# Altium footprint library 3D封装库.PcbLib: 716 footprints (part 31 of 45)
Each footprint in its own frame and in the unit in brackets; x right, y up, seen from the top. Pads: shape width x height; smd on the part's side, far side on the other; paste and mask are expansions set on the pad; w line width, h text height; cw(c..) or ccw(c..) is an arc to the next point about the centre after c.
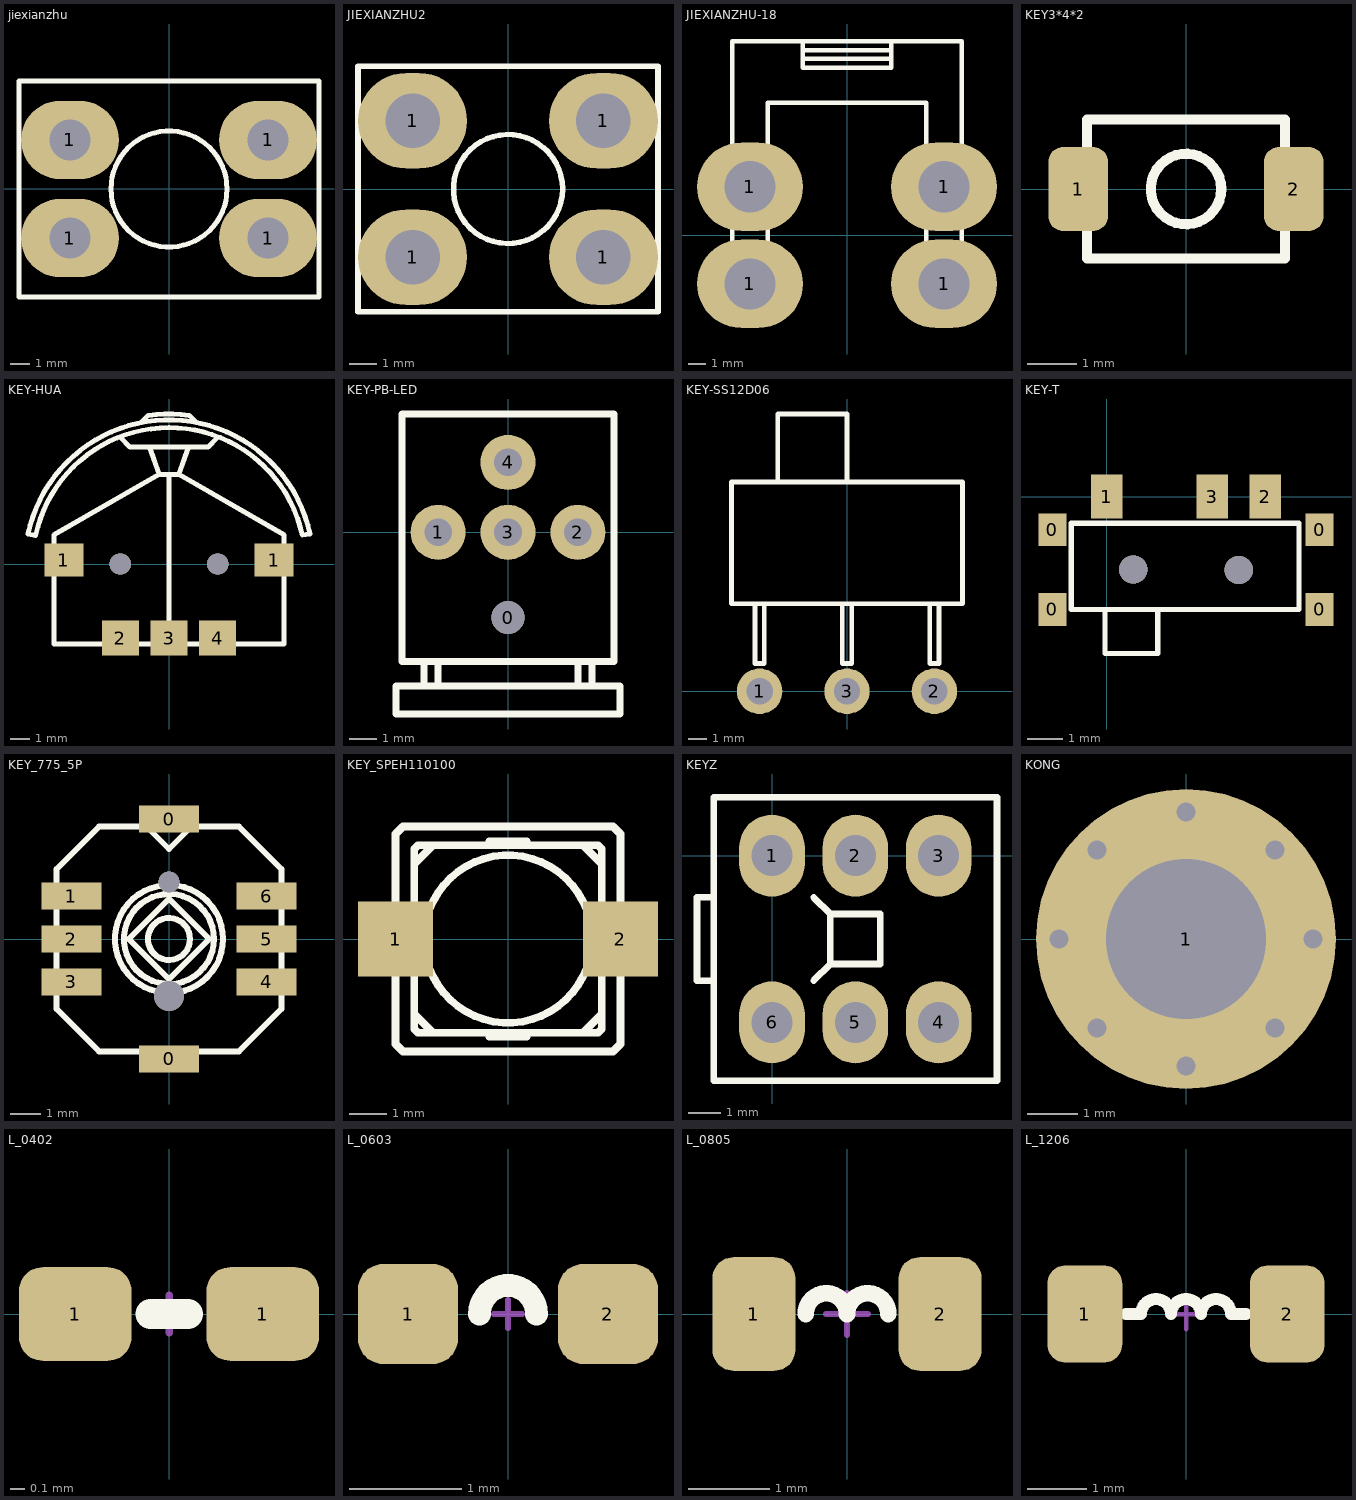
[diagram p30: the footprints below, top view; thin cyan lines are the x and y axes]

## jiexianzhu [mm]
pads (4):
  oval 5x4 hole 2.1: 1(-5.055,-2.511) 1(-5.055,2.489) 1(5.045,-2.511) 1(5.045,2.489)
Top Overlay:
  circle w0.254: c-0.005,-0.011 r2.959
  lines w0.254: -7.655,-5.511 7.645,-5.511 7.645,5.489 -7.655,5.489 -7.655,-5.511

## JIEXIANZHU2 [mm]
pads (4):
  oval 4x3.5 hole 2: 1(-3.5,-2.5) 1(-3.5,2.5) 1(3.5,-2.5) 1(3.5,2.5)
Top Overlay:
  circle w0.2: c0,0 r2
  lines w0.203: -5.5,-4.5 -5.5,4.5 5.5,4.5 5.5,-4.5 -5.5,-4.5

## JIEXIANZHU-18 [mm]
pads (4):
  oval 6x5 hole 2.9: 1(-5.5,-2.75) 1(-5.5,2.75) 1(5.5,-2.75) 1(5.5,2.75)
Top Overlay:
  lines w0.254: -2.5,10.5 2.5,10.5 ; -2.5,11 -2.5,10 ; 2.5,11 2.5,10 ; -2.5,10 -2.5,9.5 2.5,9.5 2.5,10 ; -2.5,10 2.5,10 ; -6.5,-4.5 -6.5,11 0,11 6.5,11 6.5,-4.5 4.5,-4.5 4.5,7.5 -4.5,7.5 -4.5,-4.5 -6.5,-4.5

## KEY3*4*2 [mm]
pads (2):
  rrect50% 1.2x1.7 smd: 1(-2.175,0) 2(2.175,0)
Top Overlay:
  circle w0.203: c0,0 r0.711
  lines w0.203: -2,-1.4 2,-1.4 2,1.4 -2,1.4 -2,-1.4
3D body "User Library-342button.STEP": height 2.01, standoff 0.01, extent -2.5,-1.5 2.5,1.5

## KEY-HUA [mm]
pads (5):
  rect 2x1.7 smd: 1(-5.4,0.2) 1(5.4,0.2)
  rect 1.9x1.8 smd: 2(-2.5,-3.8) 3(0,-3.8) 4(2.5,-3.8)
via 2.5,0 diameter 1.1 hole 1.1
via -2.5,0 diameter 1.1 hole 1.1
Top Overlay:
  lines w0.254: -2.5,6.5 -2,6 2,6 2.5,6.5 ; -1.386,7.3 -1.059,7.627 cw(c0,0) 1.031,7.631 1.362,7.3 ; -1,6 -0.5,4.6 ; 0,-4.1 0,4.6 ; 1,6 0.5,4.6 ; -0.5,4.6 0.5,4.6 ; -0.5,4.6 -5.9,1.5 -5.9,-4.1 5.9,-4.1 5.9,1.5 0.5,4.6 ; -7.237,1.544 cw(c0,0) 7.237,1.544 6.84,1.487 ccw(c0,0) -6.845,1.467 -7.237,1.544

## KEY-PB-LED [mm]
pads (5):
  round 1.2 hole 1.2: 0(0,-3.1)
  round 2 hole 1: 1(-2.54,0) 2(2.54,0) 3(0,0) 4(0,2.54)
Top Overlay:
  lines w0.254: -3.048,-4.7 -3.048,-5.588 -2.54,-5.588 -2.54,-4.7 ; 2.54,-4.7 2.54,-5.588 3.048,-5.588 3.048,-4.7 ; -4.064,-6.604 4.064,-6.604 4.064,-5.588 -4.064,-5.588 -4.064,-6.604 ; -3.85,-4.7 3.85,-4.7 3.85,4.3 -3.85,4.3 -3.85,-4.7

## KEY-SS12D06 [mm]
pads (3):
  round 2.5 hole 1.45: 1(-4.8,0) 2(4.8,0) 3(0,0)
Top Overlay:
  lines w0.254: -6.35,11.506 -6.35,4.8 6.35,4.8 6.35,11.5 -6.344,11.5 ; -5.054,4.8 -5.054,1.524 -4.546,1.524 -4.546,4.8 ; -3.81,11.5 -3.81,15.24 0,15.24 0,11.5 ; -0.254,4.8 -0.254,1.524 0.254,1.524 0.254,4.8 ; 4.546,4.8 4.546,1.524 5.054,1.524 5.054,4.8

## KEY-T [mm]
pads (7):
  rect 0.8x0.93 smd: 0(-1.55,-3.21) 0(-1.55,-0.94) 0(6.05,-3.21) 0(6.05,-0.94)
  rect 0.9x1.25 smd: 1(0,0) 2(4.5,0) 3(3,0)
via 0.75,-2.075 diameter 0.8 hole 0.8
via 3.75,-2.09 diameter 0.8 hole 0.8
Top Overlay:
  lines w0.15: -0.05,-3.21 -0.05,-4.46 1.45,-4.46 1.45,-3.21 ; -1.016,-3.21 -1.016,-0.762 5.461,-0.762 5.461,-3.21 -1.016,-3.21

## KEY_775_5P [mm]
pads (8):
  rect 2x0.9 smd: 0(0,-4) 0(0,4) 1(-3.25,1.425) 2(-3.25,0) 3(-3.25,-1.425) 4(3.25,-1.425) 5(3.25,0) 6(3.25,1.425)
via 0,-1.9 diameter 1 hole 1
via 0,1.9 diameter 0.7 hole 0.7
Top Overlay:
  circle w0.203: c0,0 r1.5
  circle w0.203: c0,0 r1.8
  circle w0.203: c0,0 r0.7
  lines w0.203: -0.75,3.75 0,3 0.75,3.75 ; -3.75,-2.331 -3.75,2.331 -2.331,3.75 2.331,3.75 3.75,2.331 3.75,-2.331 2.331,-3.75 -2.331,-3.75 -3.75,-2.331 ; -1.344,0 0,-1.344 1.344,0 0,1.344 -1.344,0

## KEY_SPEH110100 [mm]
pads (2):
  rect 2x2 smd: 1(-3,0) 2(3,0)
Top Overlay:
  circle w0.203: c0,0 r2.236
  lines w0.203: -2.5,-2 -2,-2.5 ; -2.5,2 -2,2.5 ; -0.5,-2.6 0.5,-2.6 ; -0.5,2.6 0.5,2.6 ; 2,-2.5 2.5,-2 ; 2,2.5 2.5,2 ; -3,-2.8 -3,2.8 -2.8,3 2.8,3 3,2.8 3,-2.8 2.8,-3 -2.8,-3 -3,-2.8 ; -2.5,-2.4 -2.5,2.4 -2.4,2.5 2.4,2.5 2.5,2.4 2.5,-2.4 2.4,-2.5 -2.4,-2.5 -2.5,-2.4

## KEYZ [mm]
pads (6):
  oval 2x2.5 hole 1.25: 1(0,0) 2(2.54,0) 3(5.08,0) 4(5.08,-5.08) 5(2.54,-5.08) 6(0,-5.08)
Top Overlay:
  lines w0.203: -1.778,-3.81 -2.286,-3.81 -2.286,-1.27 -1.778,-1.27 ; 1.27,-3.81 1.778,-3.302 ; 1.27,-1.27 1.778,-1.778 ; 1.778,-3.302 3.302,-3.302 3.302,-1.778 1.778,-1.778 ; 1.778,-3.302 1.778,-1.778 ; -1.778,-6.858 6.858,-6.858 6.858,1.778 -1.778,1.778 -1.778,-6.858

## KONG [mm]
pads (1):
  round 6 hole 3.2: 1(0,0)
via -1.778,-1.778 diameter 0.508 hole 0.381
via 1.778,-1.778 diameter 0.508 hole 0.381
via 1.778,1.778 diameter 0.508 hole 0.381
via -1.778,1.778 diameter 0.508 hole 0.381
via -2.54,0 diameter 0.508 hole 0.381
via 2.54,0 diameter 0.508 hole 0.381
via 0,-2.54 diameter 0.508 hole 0.381
via 0,2.54 diameter 0.508 hole 0.381

## L_0402 [mil] "小功率贴片电感"
pads (2):
  rrect50% 30x25 smd: 1(-25,0) 1(25,0)
Top Overlay:
  lines w8: -5,0 5,0
Mechanical 15:
  lines w2: -5,0 5,0 ; 0,-5 0,5
3D body "0402.STEP": height 19.68, standoff -0.11, extent -19.69,-9.84 19.69,9.84

## L_0603 [mil] "小功率贴片电感"
pads (2):
  rrect50% 35x35 smd: 1(-35,0) 2(35,0)
Top Overlay:
  lines w8: -10,0 cw(c0,0) 10,0
Mechanical 15:
  lines w2: -5,0 5,0 ; 0,-5 0,0 0,5
3D body "0603.STEP": height 31.5, standoff -0.11, extent -31.5,-15.75 31.5,15.75

## L_0805 [mil] "小功率贴片电感"
pads (2):
  rrect50% 40x55 smd: 1(-45,0) 2(45,0)
Top Overlay:
  lines w8: -20,0 cw(c-10,0) 0,0 cw(c10,0) 20,0
Mechanical 15:
  lines w3: -10,0 10,0 ; 0,-10 0,10
3D body "0805.STEP": height 35.43, standoff -0.11, extent -39.37,-23.62 39.37,23.62

## L_1206 [mil] "小功率贴片电感"
pads (2):
  rrect50% 50x65 smd: 1(-67.5,0) 2(67.5,0)
Top Overlay:
  lines w8: -40,0 -30,0 cw(c-20,0) -10,0 cw(c0,0) 10,0 cw(c20,0) 30,0 40,0
Mechanical 15:
  lines w3: -10,0 10,0 ; 0,-10 0,10
3D body "1206.STEP": height 35.43, standoff -0.19, extent -62.99,-31.5 62.99,31.5